# Altium footprint library LUMI_Standard_Auto_Soldering_LIB.PcbLib: 344 footprints (part 17 of 22)
Each footprint in its own frame and in the unit in brackets; x right, y up, seen from the top. Pads: shape width x height; smd on the part's side, far side on the other; paste and mask are expansions set on the pad; w line width, h text height; cw(c..) or ccw(c..) is an arc to the next point about the centre after c.
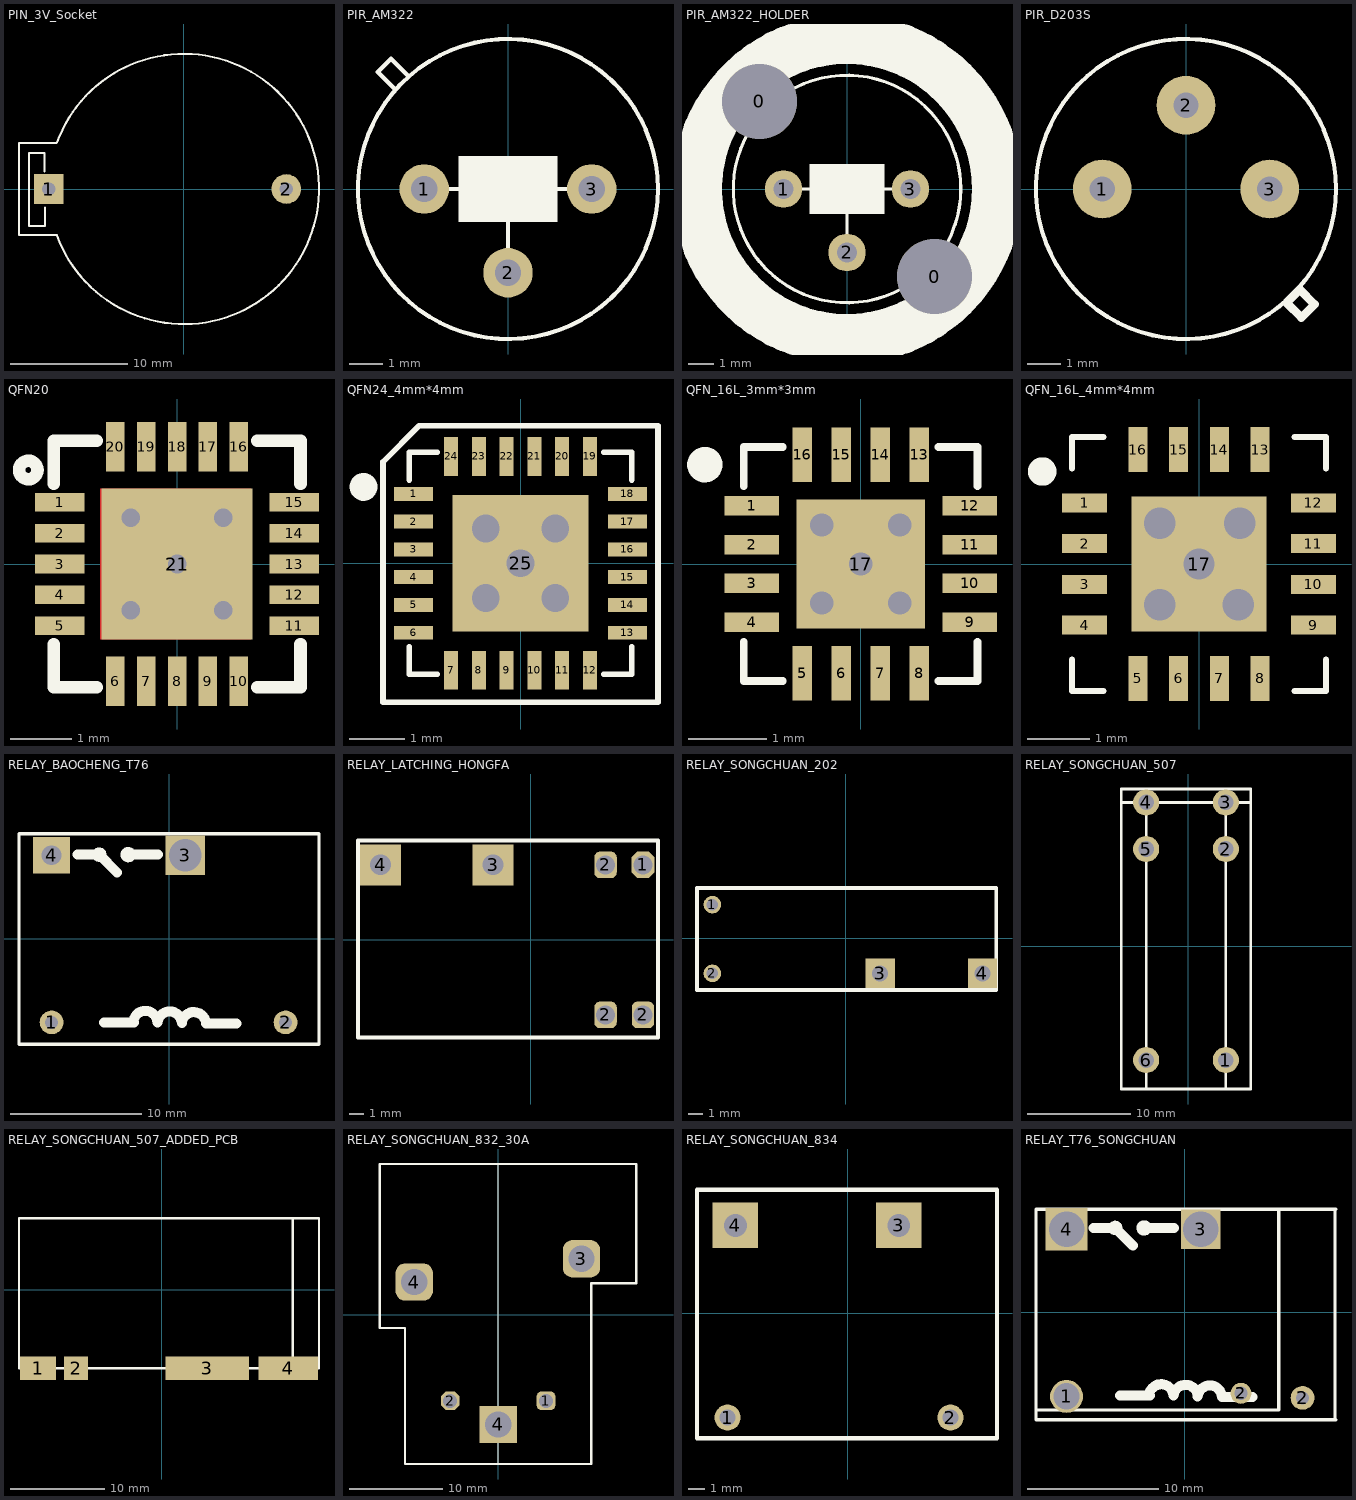
[diagram p16: the footprints below, top view; thin cyan lines are the x and y axes]

## PIN_3V_Socket [mil]
pads (2):
  rect 100x100 hole 45: 1(-454.69,0.04)
  round 100 hole 45: 2(345.31,0.04)
Top Overlay:
  lines w7: -468.69,59.04 -468.69,121.04 -520.68,121.04 -520.68,-123.96 -467.69,-123.96 -467.69,-62.96 ; -428.36,155.04 -554.68,155.04 -554.68,-154.96 -426.75,-154.96 ; -427.08,156.11 cw(c0.32,0.04) -426.75,-156.93
3D body: height 278.16, standoff -137.2, extent -582.77,-446.79 547.15,448.87

## PIR_AM322 [mm]
pads (3):
  round 1.5 hole 0.8: 1(-2.54,0) 2(0,-2.54) 3(2.54,0)
Top Overlay:
  circle w0.127: c0,0 r4.55
  rectangle: -1.5,-1 1.5,1
  lines w0.127: -3.45,3.05 -3.95,3.55 ; -2.54,0 0,0 ; 0,-2.54 0,0 ; 2.54,0 0,0 ; -3.95,3.55 -3.95,3.55 ; -3.95,3.55 -3.55,3.95 -3.05,3.45 ; -3.05,3.45 -3.05,3.45
3D body: height 4.7, standoff -2, extent -4.55,-4.55 4.52,4.55

## PIR_AM322_HOLDER [mm]
pads (5):
  round 3 hole 3: 0(-3.5,3.5) 0(3.5,-3.5)
  round 1.5 hole 0.8: 1(-2.54,0) 2(0,-2.54) 3(2.54,0)
Top Overlay:
  circle w0.127: c0,0 r4.55
  circle w2: c0,0 r6
  rectangle: -1.5,-1 1.5,1
  lines w0.127: -3.4,3 -3.9,3.5 ; -2.54,0 0,0 ; 0,-2.54 0,0 ; 2.54,0 0,0 ; -3.9,3.5 -3.5,3.9 -3,3.4 ; -3.9,3.5 -3.9,3.5 ; -3,3.4 -3,3.4
3D body: height 4.7, standoff -2, extent -4.55,-4.55 4.55,4.52

## PIR_D203S [mil]
pads (3):
  round 70 hole 30: 1(-100,0) 2(0,100) 3(100,0)
Top Overlay:
  circle w5: c0,0 r179.13
  lines w10: 120.08,-135.83 135.83,-120.08 153.54,-137.8 137.8,-153.54 120.08,-135.83
3D body: height 185.04, standoff -78.74, extent -179.13,-177.93 179.14,179.14

## QFN20 [mm]
pads (21):
  rect 0.8x0.3 smd paste+0 mask+0: 1(-1.9,1) 2(-1.9,0.5) 3(-1.9,0) 4(-1.9,-0.5) 5(-1.9,-1) 11(1.9,-1) 12(1.9,-0.5) 13(1.9,0) 14(1.9,0.5) 15(1.9,1)
  rect 0.3x0.8 smd paste+0 mask+0: 6(-1,-1.9) 7(-0.5,-1.9) 8(0,-1.9) 9(0.5,-1.9) 10(1,-1.9) 16(1,1.9) 17(0.5,1.9) 18(0,1.9) 19(-0.5,1.9) 20(-1,1.9)
  rect 2.45x2.45 smd paste+0 mask+0: 21(0,0)
via -0.75,0.75 diameter 0.6 hole 0.3
via -0.75,-0.75 diameter 0.6 hole 0.3
via 0.75,-0.75 diameter 0.6 hole 0.3
via 0.75,0.75 diameter 0.6 hole 0.3
via 0,0 diameter 0.6 hole 0.3
Top Layer:
  rectangle: -1.25,-1.225 1.2,1.225
Top Overlay:
  circle w0.203: c-2.413,1.524 r0.15
  lines w0.203: -2,-1.3 -2,-2 -1.3,-2 ; -2,1.3 -2,2 -1.3,2 ; 1.3,-2 2,-2 2,-1.3 ; 1.3,2 2,2 2,1.3
Top Paste:
  rectangle: -1.1,-1.1 -0.4,-0.4
  rectangle: 0.4,-1.1 1.1,-0.4
  rectangle: -0.35,-0.35 0.35,0.35
  rectangle: -1.1,0.4 -0.4,1.1
  rectangle: 0.4,0.4 1.1,1.1
Top Solder:
  rectangle: -1.25,-1.225 1.2,1.225
3D body: height 0.78, standoff -0.02, extent -2.01,-2.01 2.01,2.01

## QFN24_4mm*4mm [mm]
pads (25):
  rect 0.7x0.25 smd: 1(-1.925,1.25) 2(-1.925,0.75) 3(-1.925,0.25) 4(-1.925,-0.25) 5(-1.925,-0.75) 6(-1.925,-1.25) 13(1.925,-1.25) 14(1.925,-0.75) 15(1.925,-0.25) 16(1.925,0.25) 17(1.925,0.75) 18(1.925,1.25)
  rect 0.25x0.7 smd: 7(-1.25,-1.925) 8(-0.75,-1.925) 9(-0.25,-1.925) 10(0.25,-1.925) 11(0.75,-1.925) 12(1.25,-1.925) 19(1.25,1.925) 20(0.75,1.925) 21(0.25,1.925) 22(-0.25,1.925) 23(-0.75,1.925) 24(-1.25,1.925)
  rect 2.45x2.45 smd: 25(0,0)
via 0,0 diameter 0.584 hole 0.5
via 0.625,0.625 diameter 0.584 hole 0.5
via 0.625,-0.625 diameter 0.584 hole 0.5
via -0.625,-0.625 diameter 0.584 hole 0.5
via -0.625,0.625 diameter 0.584 hole 0.5
Top Overlay:
  circle w0.3: c-2.825,1.375 r0.1
  lines w0.102: -2,-1.5 -2,-2 -1.5,-2 ; -2,1.5 -2,2 -1.5,2 ; 1.5,-2 2,-2 2,-1.5 ; 1.5,2 2,2 2,1.5 ; -2.475,-2.5 2.475,-2.5 2.475,2.475 -1.825,2.475 -2.475,1.825 -2.475,-2.5
3D body: height 1, standoff 0, extent -2,-2 2,2

## QFN_16L_3mm*3mm [mm]
pads (17):
  rect 0.7x0.25 smd mask+0.05: 1(-1.4,0.75) 2(-1.4,0.25) 3(-1.4,-0.25) 4(-1.4,-0.75) 9(1.4,-0.75) 10(1.4,-0.25) 11(1.4,0.25) 12(1.4,0.75)
  rect 0.25x0.7 smd mask+0.05: 5(-0.75,-1.4) 6(-0.25,-1.4) 7(0.25,-1.4) 8(0.75,-1.4) 13(0.75,1.4) 14(0.25,1.4) 15(-0.25,1.4) 16(-0.75,1.4)
  rect 1.65x1.65 smd: 17(0,0)
via 0,0 diameter 0.5 hole 0.3
via -0.5,-0.5 diameter 0.5 hole 0.3
via 0.5,-0.5 diameter 0.5 hole 0.3
via 0.5,0.5 diameter 0.5 hole 0.3
via -0.5,0.5 diameter 0.5 hole 0.3
Top Overlay:
  circle w0.254: c-2,1.275 r0.1
  lines w0.1: -1.5,-1 -1.5,-1.5 -1,-1.5 ; -1.5,1 -1.5,1.5 -1,1.5 ; 1,-1.5 1.5,-1.5 1.5,-1 ; 1,1.5 1.5,1.5 1.5,1
3D body: height 0.9, standoff 0, extent -1.501,-1.501 1.501,1.501

## QFN_16L_4mm*4mm [mm]
pads (17):
  rect 0.72x0.3 smd: 1(-1.825,0.975) 2(-1.825,0.325) 3(-1.825,-0.325) 4(-1.825,-0.975) 9(1.825,-0.975) 10(1.825,-0.325) 11(1.825,0.325) 12(1.825,0.975)
  rect 0.3x0.72 smd: 5(-0.975,-1.825) 6(-0.325,-1.825) 7(0.325,-1.825) 8(0.975,-1.825) 13(0.975,1.825) 14(0.325,1.825) 15(-0.325,1.825) 16(-0.975,1.825)
  rect 2.15x2.15 smd: 17(0,0)
via -0.625,0.65 diameter 0.584 hole 0.5
via 0.65,0.65 diameter 0.584 hole 0.5
via 0.625,-0.65 diameter 0.584 hole 0.5
via -0.625,-0.65 diameter 0.584 hole 0.5
via 0,0 diameter 0.584 hole 0.5
Top Overlay:
  circle w0.254: c-2.5,1.475 r0.1
  lines w0.1: -2.025,-1.525 -2.025,-2.025 -1.525,-2.025 ; -2.025,1.525 -2.025,2.025 -1.525,2.025 ; 1.525,-2.025 2.025,-2.025 2.025,-1.525 ; 1.525,2.025 2.025,2.025 2.025,1.525
3D body: height 0.92, standoff 0.02, extent -2,-2 2,2

## RELAY_BAOCHENG_T76 [mm]
pads (4):
  round 1.8 hole 1: 1(-8.925,-6.35) 2(8.855,-6.35)
  rect 3x3 hole 2.5: 3(1.235,6.35)
  rect 2.794x2.794 hole 1.5: 4(-8.925,6.35)
Top Overlay:
  circle w0.254: c-3.1,6.4 r0.46
  circle w0.254: c-5.3,6.4 r0.426
  lines w0.254: -11.4,-8.013 11.4,-8.013 11.4,7.987 -11.4,7.987 -11.4,-8.013
  lines w0.762: -6.95,6.4 -5.8,6.4 -5.3,6.4 -3.95,5.05 ; -4.95,-6.35 -2.65,-6.35 ; -3.1,6.4 -0.825,6.4 ; -2.721,-6.303 cw(c-1.8,-6.4) -0.875,-6.35 cw(c0.046,-6.447) 0.971,-6.397 cw(c1.893,-6.494) 2.818,-6.444 5.118,-6.444
3D body: height 11, standoff 0.2, extent -11.65,-8.213 11.65,8.187
3D body: height 5, standoff -3, extent 0.144,5.252 2.335,7.448
3D body: height 5, standoff -3, extent 8.458,-6.749 9.255,-5.951
3D body: height 5, standoff -3, extent -8.925,5.651 -7.531,7.049
3D body: height 5, standoff -3, extent -9.322,-6.749 -8.525,-5.951

## RELAY_LATCHING_HONGFA [mil]
pads (6):
  oct 60.12x70.87 hole 50: 1(300,200)
  rrect50% 60x70.87 hole 50: 2(200,-200) 2(200,200) 2(300,-200)
  rect 110x110 hole 55.12: 3(-100,200) 4(-400,200)
Top Overlay:
  lines w10: -460,-260 -460,264.72 340,264.72 340,-260 -460,-260

## RELAY_SONGCHUAN_202 [mm]
pads (4):
  round 1.2 hole 0.8: 1(-9.15,2.3) 2(-9.15,-2.4)
  rect 2x2 hole 1.1: 3(2.35,-2.4) 4(9.35,-2.4)
Top Overlay:
  lines w0.254: -10.2,-3.55 -10.2,3.45 10.3,3.45 10.3,-3.55 -10.2,-3.55
3D body: height 15.3, standoff 0, extent -10.25,-3.5 10.25,3.5
3D body: height 5, standoff -3, extent -9.398,-2.65 -8.9,-2.151
3D body: height 5, standoff -3, extent 1.953,-2.799 2.75,-2.001
3D body: height 5, standoff -3, extent 8.953,-2.799 9.75,-2.001
3D body: height 5, standoff -3, extent -9.398,2.05 -8.9,2.549

## RELAY_SONGCHUAN_507 [mm]
pads (6):
  round 2.524 hole 1.5: 1(3.65,-11) 2(3.65,9.4) 3(3.65,13.9) 4(-4.05,13.9) 5(-4.05,9.4) 6(-4.05,-11)
Top Overlay:
  lines w0.254: -6.45,13.9 6.05,13.9 ; -4.05,-13.8 -4.05,13.9 -4.05,15.1 ; 3.65,-13.8 3.65,13.9 3.65,15.2 ; -6.45,-13.8 -6.45,15.2 6.05,15.2 6.05,-13.8 -6.45,-13.8
3D body: height 5, standoff -3, extent -4.744,13.202 -3.35,14.599
3D body: height 5, standoff -3, extent -4.744,8.702 -3.35,10.099
3D body: height 5, standoff -3, extent 2.956,13.202 4.35,14.599
3D body: height 5, standoff -3, extent 2.956,8.702 4.35,10.099
3D body: height 5, standoff -3, extent 2.956,-11.698 4.35,-10.301
3D body: height 5, standoff -3, extent -4.744,-11.698 -3.35,-10.301
3D body: height 15.7, standoff 0, extent -6.45,-13.8 6.05,15.2

## RELAY_SONGCHUAN_507_ADDED_PCB [mil]
pads (4):
  rect 150x100 smd: 1(-520,-330)
  rect 100x100 smd: 2(-360,-330)
  rect 350x100 smd: 3(190,-330)
  rect 250x100 smd: 4(530,-330)
Top Overlay:
  lines w10: 550,-330 550,300 ; -600,-330 -600,300 660,300 660,-330 -600,-330
3D body: height 492.13, standoff 0, extent -600,-436.22 660,300

## RELAY_SONGCHUAN_832_30A [mm]
pads (5):
  rrect50% 2x2 hole 1.5: 1(5.127,-9.26)
  oct 2x2 hole 1.5: 2(-5.16,-9.26)
  rrect50% 4x4 hole 2.8: 3(8.937,5.98) 4(-9.011,3.481)
  rect 4x4 hole 2.8: 4(0,-11.8)
Top Overlay:
  lines w0.1: 0,-16.046 0,16.154
  lines w0.254: -12.7,-1.446 -10,-1.446 -10,-16.046 10,-16.046 10,3.354 14.8,3.354 14.8,16.154 -12.7,16.154 -12.7,-1.446
3D body: height 5, standoff -3, extent 4.73,-9.659 5.527,-8.861
3D body: height 5, standoff -3, extent -5.541,-9.659 -4.744,-8.861
3D body: height 20.4, standoff 0.2, extent -12.7,-16.046 14.8,16.154

## RELAY_SONGCHUAN_834 [mm]
pads (4):
  round 1.6 hole 1: 1(-7.4,-6.4) 2(6.3,-6.4)
  rect 2.794x2.794 hole 1.4: 3(3.116,5.411) 4(-6.917,5.411)
Top Overlay:
  lines w0.254: -9.28,-7.67 -9.28,7.6 9.161,7.6 9.161,-7.67 -9.28,-7.67
3D body: height 5, standoff -3, extent 5.916,-6.787 6.713,-5.988
3D body: height 5, standoff -3, extent -7.612,4.713 -6.217,6.11
3D body: height 5, standoff -3, extent 2.421,4.713 3.816,6.11
3D body: height 5, standoff -3, extent -7.797,-6.799 -7,-6.001
3D body: height 11, standoff 0.2, extent -9.28,-7.67 9.161,7.6

## RELAY_T76_SONGCHUAN [mm]
pads (6):
  round 2.5 hole 2: 1(-9,-6.4)
  round 1.6 hole 1: 2(4.26,-6.165) 2(4.26,-6.165)
  round 1.8 hole 1: 2(8.935,-6.515)
  rect 3x3 hole 2.7: 3(1.2,6.3)
  rect 3.2x3.2 hole 2.7: 4(-9,6.3)
Top Overlay:
  circle w0.254: c-3.1,6.4 r0.46
  circle w0.254: c-5.3,6.4 r0.426
  lines w0.254: 11.4,-8 11.4,7.8 ; 11.48,-8.177 -11.32,-8.177 -11.32,7.823 11.48,7.823 ; -11.32,-7.435 7.12,-7.435 ; -11.32,-7.435 7.12,-7.435 ; -11.32,-7.435 -11.32,7.835 ; -11.32,-7.435 7.12,-7.435 ; -11.32,7.835 7.12,7.835 ; -11.32,7.835 7.12,7.835 ; -11.32,7.835 7.12,7.835 ; 7.12,-7.435 7.12,7.835 ; 7.12,-7.435 7.12,7.835 ; 7.12,-7.435 7.12,7.835
  lines w0.762: -6.95,6.4 -5.8,6.4 -5.3,6.4 -3.95,5.05 ; -5.8,6.413 -5.3,6.413 ; -4.95,-6.35 -2.65,-6.35 ; -3.1,6.4 -0.825,6.4 ; -2.721,-6.303 cw(c-1.8,-6.4) -0.875,-6.35 cw(c0.046,-6.447) 0.971,-6.397 cw(c1.893,-6.494) 2.818,-6.444 5.118,-6.444 ; 2.818,-6.431 5.118,-6.431
3D body: height 11, standoff 0.2, extent -11.57,-8.377 11.73,8.023
3D body: height 5, standoff -3, extent 0.224,5.087 2.415,7.283
3D body: height 5, standoff -3, extent 8.538,-6.914 9.335,-6.116
3D body: height 5, standoff -3, extent -8.845,5.486 -7.451,6.884
3D body: height 5, standoff -3, extent -9.242,-6.914 -8.445,-6.116
3D body: height 5, standoff -3, extent 3.876,-6.552 4.673,-5.753
3D body: height 5, standoff -3, extent -9.652,4.948 -8.258,6.345
3D body: height 5, standoff -3, extent 0.381,4.948 1.775,6.345
3D body: height 5, standoff -3, extent -9.837,-6.564 -9.04,-5.766
3D body: height 11, standoff 0.2, extent -11.32,-7.435 7.12,7.835
3D body: height 5, standoff -3, extent 0.144,5.265 2.335,7.461
3D body: height 5, standoff -3, extent 8.458,-6.736 9.255,-5.938
3D body: height 5, standoff -3, extent -8.925,5.664 -7.53,7.061
3D body: height 5, standoff -3, extent -9.322,-6.736 -8.525,-5.938
3D body: height 5, standoff -3, extent 3.876,-6.552 4.673,-5.753
3D body: height 5, standoff -3, extent -9.652,4.948 -8.258,6.345
3D body: height 5, standoff -3, extent 0.381,4.948 1.775,6.345
3D body: height 5, standoff -3, extent -9.837,-6.564 -9.04,-5.766
3D body: height 11, standoff 0.2, extent -11.32,-7.435 7.12,7.835
3D body: height 5, standoff -3, extent 0.144,5.252 2.335,7.448
3D body: height 5, standoff -3, extent 8.458,-6.749 9.255,-5.951
3D body: height 5, standoff -3, extent -8.925,5.651 -7.531,7.049
3D body: height 5, standoff -3, extent -9.322,-6.749 -8.525,-5.951
3D body: height 5, standoff -3, extent 3.876,-6.552 4.673,-5.753
3D body: height 5, standoff -3, extent -9.652,4.948 -8.258,6.345
3D body: height 5, standoff -3, extent 0.381,4.948 1.775,6.345
3D body: height 5, standoff -3, extent -9.837,-6.564 -9.04,-5.766
3D body: height 11, standoff 0.2, extent -11.32,-7.435 7.12,7.835